# Altium footprint library KNR_Kurs.PcbLib: 250 footprints (part 11 of 16)
Each footprint in its own frame and in the unit in brackets; x right, y up, seen from the top. Pads: shape width x height; smd on the part's side, far side on the other; paste and mask are expansions set on the pad; w line width, h text height; cw(c..) or ccw(c..) is an arc to the next point about the centre after c.
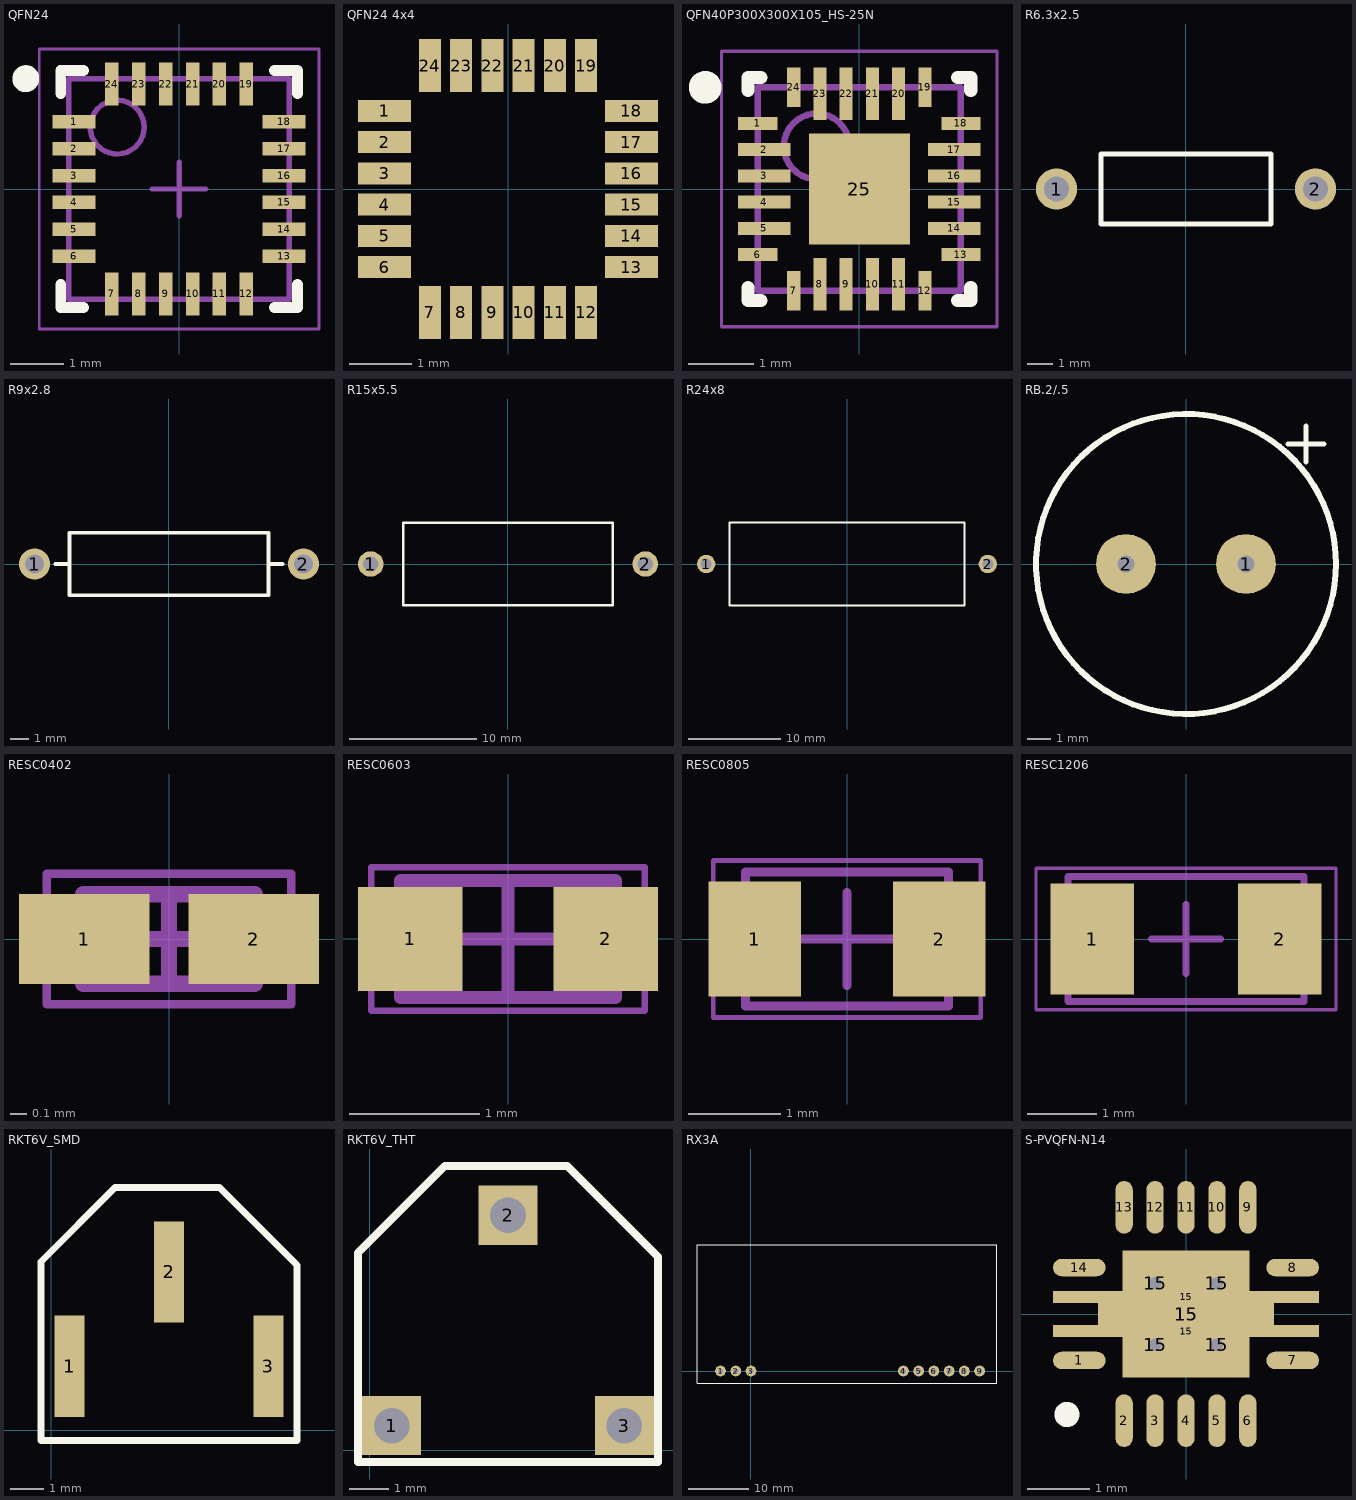
[diagram p10: the footprints below, top view; thin cyan lines are the x and y axes]

## QFN24 [mm] "QFN, 24-Leads, Body 4,00x4,00mm, Pitch 0,50mm, Thermal Pad 2,70x2,60mm, IPC Medium Density"
height 0.95
pads (24):
  rect 0.8x0.25 smd mask+0.07: 1(-1.95,1.25) 2(-1.95,0.75) 3(-1.95,0.25) 4(-1.95,-0.25) 5(-1.95,-0.75) 6(-1.95,-1.25) 13(1.95,-1.25) 14(1.95,-0.75) 15(1.95,-0.25) 16(1.95,0.25) 17(1.95,0.75) 18(1.95,1.25)
  rect 0.25x0.8 smd mask+0.07: 7(-1.25,-1.95) 8(-0.75,-1.95) 9(-0.25,-1.95) 10(0.25,-1.95) 11(0.75,-1.95) 12(1.25,-1.95) 19(1.25,1.95) 20(0.75,1.95) 21(0.25,1.95) 22(-0.25,1.95) 23(-0.75,1.95) 24(-1.25,1.95)
Top Overlay:
  circle w0.25: c-2.85,2.05 r0.125
  lines w0.2: -2.2,-1.775 -2.2,-2.2 -1.775,-2.2 ; -2.2,1.775 -2.2,2.2 -1.775,2.2 ; 1.775,-2.2 2.2,-2.2 2.2,-1.775 ; 1.775,2.2 2.2,2.2 2.2,1.775
Mechanical 13:
  circle w0.1: c-1.15,1.15 r0.5
  lines w0.1: -2.05,-2.05 -2.05,2.05 2.05,2.05 2.05,-2.05 -2.05,-2.05
Mechanical 15:
  lines w0.05: -2.6,-2.6 -2.6,2.6 2.6,2.6 2.6,-2.6 -2.6,-2.6
  lines w0.1: -0.5,0 0.5,0 ; 0,-0.5 0,0.5
3D body "User Library-mpu-6050_qfn-24(1).step": height 0.88, standoff -0.02, extent -2.02,-2.02 2.02,2.02

## QFN24 4x4 [mm]
pads (24):
  rect 0.85x0.35 smd mask+0.07: 1(-1.975,1.25) 2(-1.975,0.75) 3(-1.975,0.25) 4(-1.975,-0.25) 5(-1.975,-0.75) 6(-1.975,-1.25) 13(1.975,-1.25) 14(1.975,-0.75) 15(1.975,-0.25) 16(1.975,0.25) 17(1.975,0.75) 18(1.975,1.25)
  rect 0.35x0.85 smd mask+0.07: 7(-1.25,-1.975) 8(-0.75,-1.975) 9(-0.25,-1.975) 10(0.25,-1.975) 11(0.75,-1.975) 12(1.25,-1.975) 19(1.25,1.975) 20(0.75,1.975) 21(0.25,1.975) 22(-0.25,1.975) 23(-0.75,1.975) 24(-1.25,1.975)
3D body "User Library-mpu-6050_qfn-24(1).step": height 0.88, standoff -0.02, extent -2,-2.02 2.04,2.02

## QFN40P300X300X105_HS-25N [mm] "QFN, 24-Leads, Body 3,00x3,00mm, Pitch 0,40mm, Thermal Pad 1,54x1,70mm, IPC Medium Density"
height 1.05
pads (25):
  rect 0.6x0.2 smd mask+0.07: 1(-1.55,1) 6(-1.55,-1) 13(1.55,-1) 18(1.55,1)
  rect 0.8x0.2 smd mask+0.07: 2(-1.45,0.6) 3(-1.45,0.2) 4(-1.45,-0.2) 5(-1.45,-0.6) 14(1.45,-0.6) 15(1.45,-0.2) 16(1.45,0.2) 17(1.45,0.6)
  rect 0.2x0.6 smd mask+0.07: 7(-1,-1.55) 12(1,-1.55) 19(1,1.55) 24(-1,1.55)
  rect 0.2x0.8 smd mask+0.07: 8(-0.6,-1.45) 9(-0.2,-1.45) 10(0.2,-1.45) 11(0.6,-1.45) 20(0.6,1.45) 21(0.2,1.45) 22(-0.2,1.45) 23(-0.6,1.45)
  rect 1.54x1.7 smd mask+0.07: 25(0,0)
Top Overlay:
  circle w0.25: c-2.35,1.55 r0.125
  lines w0.2: -1.7,-1.5 -1.7,-1.7 -1.5,-1.7 ; -1.7,1.5 -1.7,1.7 -1.5,1.7 ; 1.5,-1.7 1.7,-1.7 1.7,-1.5 ; 1.5,1.7 1.7,1.7 1.7,1.5
Mechanical 13:
  circle w0.1: c-0.65,0.65 r0.5
  lines w0.1: -1.55,-1.55 1.55,-1.55 1.55,1.55 -1.55,1.55 -1.55,-1.55
Mechanical 15:
  lines w0.05: -2.1,-2.1 2.1,-2.1 2.1,2.1 -2.1,2.1 -2.1,-2.1
  lines w0.1: -0.5,0 0.5,0 ; 0,-0.5 0,0.5
3D body "QFN40P300X300X105_HS-25N.step": height 1.05, standoff 0, extent -1.551,-1.551 1.551,1.551

## R6.3x2.5 [mm] "Resistor, Axial; Body 6.8 x 2.7 mm (LxDia. max), Lead Dia. 0.65 mm (max)"
height 2.7
pads (2):
  round 1.65 hole 1: 1(-5.175,0) 2(5.175,0)
Top Overlay:
  lines w0.2: -3.4,-1.4 -3.4,1.4 3.4,1.4 3.4,-1.4 -3.4,-1.4
3D body "THT_RES_10_35.stp": height 2.92, standoff -1, extent -5.4,-0.945 5.4,0.9

## R9x2.8 [mm] "Resistor, Axial; Body 10.5 x 3.3 mm (LxDia. max), Lead Dia. 0.7 mm (max)"
height 3.3
pads (2):
  round 1.65 hole 1: 1(-7.1,0) 2(7.1,0)
Top Overlay:
  lines w0.2: -6,0 -5.25,0 ; 5.25,0 6,0 ; -5.25,-1.65 5.25,-1.65 5.25,1.65 -5.25,1.65 -5.25,-1.65

## R15x5.5 [mm] "Resistor, Axial; Body 16.5 x 6.5 mm (LxDia. max), Lead Dia. 0.85 mm (max)"
height 6.5
pads (2):
  round 2 hole 1.2: 1(-10.8,0) 2(10.8,0)
Top Overlay:
  lines w0.2: -8.25,-3.25 8.25,-3.25 8.25,3.25 -8.25,3.25 -8.25,-3.25

## R24x8 [mm] "Resistor, Axial; Body 25.5 x 9 mm (LxDia. max), Lead Dia. 0.85 mm (max)"
height 9
pads (2):
  round 2 hole 1.2: 1(-15.3,0) 2(15.3,0)
Top Overlay:
  lines w0.2: -12.75,-4.5 -12.75,4.5 12.75,4.5 12.75,-4.5 -12.75,-4.5

## RB.2/.5 [mil]
pads (2):
  round 100 hole 28: 1(100,0) 2(-100,0)
Top Overlay:
  circle w10: c0,0 r250
  lines w7.87: 170,200 230,200 ; 200,170 200,230
3D body: height 1023.62, standoff 196.85, extent -244.09,-248.03 250.01,247.05
3D body: height 196.85, standoff 0, extent 86.61,-7.87 110.14,15.7
3D body: height 196.85, standoff 0, extent -114.17,-11.81 -90.64,11.76

## RESC0402 [mm]
height 0.37
pads (2):
  rect 0.8x0.55 smd: 1(-0.52,0) 2(0.52,0)
Mechanical 13:
  lines w0.1: -0.525,-0.275 0.525,-0.275 0.525,0.275 -0.525,0.275 -0.525,-0.275
Mechanical 15:
  lines w0.05: -0.75,-0.4 0.75,-0.4 0.75,0.4 -0.75,0.4 -0.75,-0.4
  lines w0.1: -0.275,0 0.275,0 ; 0,-0.275 0,0.275
3D body "User Library-RES_1005-0402.step": height 0.41, standoff 0, extent -0.575,-0.275 0.575,0.275

## RESC0603 [mm] "Chip Resistor, 2-Leads, Body 1,57x0,80mm, IPC High Density"
height 0.55
pads (2):
  rect 0.8x0.8 smd: 1(-0.75,0) 2(0.75,0)
Mechanical 13:
  lines w0.1: -0.825,-0.45 0.825,-0.45 0.825,0.45 -0.825,0.45 -0.825,-0.45
Mechanical 15:
  lines w0.05: -1.05,-0.55 1.05,-0.55 1.05,0.55 -1.05,0.55 -1.05,-0.55
  lines w0.1: -0.45,0 0.45,0 ; 0,-0.45 0,0.45
3D body "User Library-RES_1609-0603.step": height 0.56, standoff 0, extent -0.85,-0.4 0.85,0.4

## RESC0805 [mm]
pads (2):
  rect 1x1.25 smd: 1(-1,0) 2(1,0)
Mechanical 13:
  lines w0.1: -1.1,-0.725 -1.1,0.725 1.1,0.725 1.1,-0.725 -1.1,-0.725
Mechanical 15:
  lines w0.05: -1.45,-0.85 -1.45,0.85 1.45,0.85 1.45,-0.85 -1.45,-0.85
  lines w0.1: -0.5,0 0.5,0 ; 0,-0.5 0,0.5
3D body "User Library-RES_2013-0805.step": height 0.76, standoff 0, extent -1.15,-0.675 1.15,0.675

## RESC1206 [mm]
pads (2):
  rect 1.2x1.6 smd: 1(-1.35,0) 2(1.35,0)
Mechanical 13:
  lines w0.1: -1.7,-0.9 1.7,-0.9 1.7,0.9 -1.7,0.9 -1.7,-0.9
Mechanical 15:
  lines w0.05: -2.159,-1.016 2.159,-1.016 2.159,1.016 -2.159,1.016 -2.159,-1.016
  lines w0.1: -0.5,0 0.5,0 ; 0,-0.5 0,0.5
3D body "User Library-RES_3216-1206(1).step": height 0.85, standoff 0, extent -1.675,-0.865 1.675,0.865

## RKT6V_SMD [mm] "SMD version of STK6V THT element"
pads (3):
  rect 0.9x3 smd: 1(0.55,1.9) 2(3.5,4.7) 3(6.45,1.9)
Top Overlay:
  lines w0.2: -0.3,-0.3 -0.3,0 -0.3,4.7 -0.3,5 1.9,7.2 5,7.2 7.3,4.9 7.3,-0.3 -0.3,-0.3
3D body "RTK6V-SMD.stp": height 7.5, standoff 0, extent 0,0 7,7

## RKT6V_THT [mm] "RTK6V THT version of THT element"
pads (3):
  rect 1.5x1.5 hole 0.9 square: 1(0.55,0.625) 2(3.5,5.95) 3(6.45,0.625)
Top Overlay:
  lines w0.2: -0.3,-0.3 -0.3,0 -0.3,4.7 -0.3,5 1.9,7.2 5,7.2 7.3,4.9 7.3,-0.3 -0.3,-0.3
3D body "RTK6V-THT.stp": height 7.5, standoff -2, extent 0,0 7,7

## RX3A [mm]
pads (9):
  round 1.8 hole 0.9: 1(-5.08,0) 2(-2.54,0) 3(0,0) 4(25.4,0) 5(27.94,0) 6(30.48,0) 7(33.02,0) 8(35.56,0) 9(38.1,0)
Top Overlay:
  lines w0.2: -9,-2 41,-2 41,21 -9,21 -9,-2
3D body "RX3A_blended.stp": height 6, standoff -2, extent -7.498,-0.254 39.502,19.746

## S-PVQFN-N14 [mm]
pads (22):
  oval 0.85x0.28 smd mask+0.07: 1(-1.725,-0.75) 7(1.725,-0.75) 8(1.725,0.75) 14(-1.725,0.75)
  oval 0.28x0.85 smd mask+0.07: 2(-1,-1.725) 3(-0.5,-1.725) 4(0,-1.725) 5(0.5,-1.725) 6(1,-1.725) 9(1,1.725) 10(0.5,1.725) 11(0,1.725) 12(-0.5,1.725) 13(-1,1.725)
  round 0.5 hole 0.2 mask+0.07: 15(-0.5,-0.5) 15(-0.5,0.5) 15(0.5,-0.5) 15(0.5,0.5)
  rect 4.3x0.2 smd mask+0.07: 15(0,-0.275) 15(0,0.275)
  rect 2.05x2.05 smd mask+0.07: 15(0,0)
  rect 2.85x0.75 smd mask+0.07: 15(0,0)
Top Overlay:
  circle w0.254: c-1.925,-1.625 r0.076
3D body "User Library-QFN-14_Therm.STEP": height 1, standoff 0, extent -1.75,-1.75 1.75,1.75